# Altium footprint library TinyShuffle v.0.PcbLib: 44 footprints (part 2 of 3)
Each footprint in its own frame and in the unit in brackets; x right, y up, seen from the top. Pads: shape width x height; smd on the part's side, far side on the other; paste and mask are expansions set on the pad; w line width, h text height; cw(c..) or ccw(c..) is an arc to the next point about the centre after c.
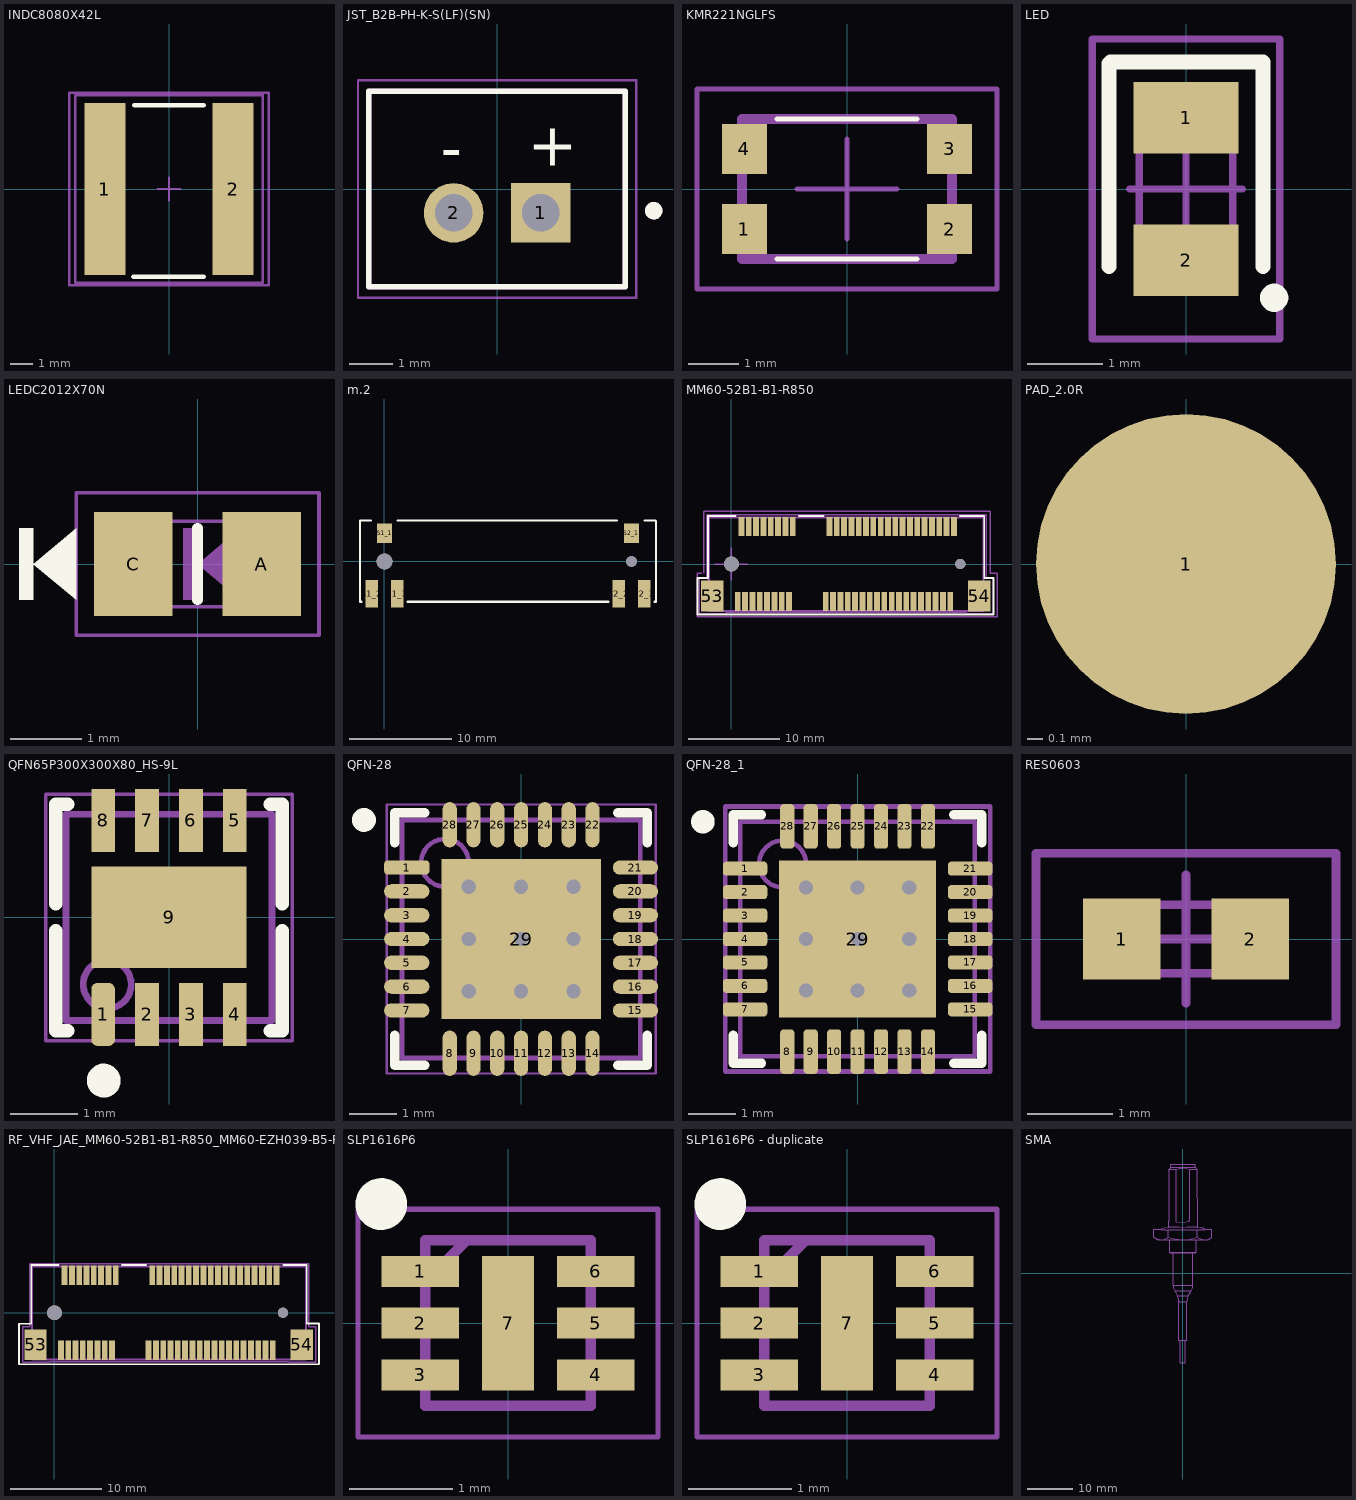
[diagram p1: the footprints below, top view; thin cyan lines are the x and y axes]

## INDC8080X42L [mm] "Chip Inductor, 2-Leads, Body 8,00x8,00mm, IPC High Density"
height 4.2
pads (2):
  rect 1.8x7.5 smd: 1(-2.8,0) 2(2.8,0)
Top Overlay:
  lines w0.2: -1.549,-3.835 1.524,-3.835 ; -1.524,3.658 1.524,3.658
Top Assembly:
  lines w0.1: -4.1,-4.1 -4.1,4.1 4.1,4.1 4.1,-4.1 -4.1,-4.1
Top Courtyard:
  lines w0.1: -0.5,0 0.5,0 ; 0,-0.5 0,0.5 ; -4.35,-4.2 -4.35,4.2 4.35,4.2 4.35,-4.2 -4.35,-4.2
3D body "INDC8080X42L.step": height 4.2, standoff 0, extent -4.1,-4.1 4.1,4.1

## JST_B2B-PH-K-S(LF)(SN) [mm]
pads (2):
  rect 1.368x1.368 hole 0.86: 1(1,-0.55)
  round 1.368 hole 0.86: 2(-1,-0.55)
Top Overlay:
  circle w0.2: c3.6,-0.5 r0.1
  lines w0.127: -2.95,-2.25 -2.95,2.25 2.95,2.25 2.95,-2.25 -2.95,-2.25
  text "-" at -1.3,0.45 h1
  text "+" at 0.7,0.533 h1
Top Component Outline:
  circle w0.2: c3.6,-0.5 r0.1
  lines w0.127: -2.95,-2.25 2.95,-2.25 2.95,2.25 -2.95,2.25 -2.95,-2.25
Top Courtyard:
  lines w0.05: -3.2,-2.5 3.2,-2.5 3.2,2.5 -3.2,2.5 -3.2,-2.5
3D body "B2B-PH-K-S(LF)(SN)--3DModel-STEP-56544.STEP": height 6.01, standoff -3.39, extent -2.95,-2.25 2.95,2.25

## KMR221NGLFS [mm]
pads (4):
  rect 0.9x1 smd: 1(-2.05,-0.8) 2(2.05,-0.8) 3(2.05,0.8) 4(-2.05,0.8)
Top Overlay:
  lines w0.1: -1.4,-1.4 1.4,-1.4 ; -1.4,1.4 1.4,1.4
Top Component Outline:
  lines w0.2: -2.1,-1.4 -2.1,1.4 2.1,1.4 2.1,-1.4 -2.1,-1.4
Top Courtyard:
  lines w0.1: -1,0 0,0 ; 0,-1 0,0 ; 0,1 0,0 ; 1,0 0,0 ; -3,-2 -3,2 3,2 3,-2 -3,-2
3D body "User Library-Switch-CK-KMR2.STEP": height 2.1, standoff 0, extent -2.35,-1.478 2.25,1.522

## LED [mm]
pads (2):
  rect 1.4x0.95 smd: 1(0,0.95) 2(0,-0.95)
Top Overlay:
  circle w0.254: c1.175,-1.45 r0.062
  lines w0.2: -1.025,-1.034 -1.025,1.675 -1.009,1.691 1.025,1.691 1.025,-1.034
Top Component Outline:
  lines w0.1: -0.625,-1 0.625,-1 0.625,1 -0.625,1 -0.625,-1
Top Courtyard:
  lines w0.1: -0.75,0 0,0 ; 0,-0.75 0,0 ; 0,0.75 0,0 ; 0.75,0 0,0 ; -1.25,-2 -1.25,2 1.25,2 1.25,-2 -1.25,-2
3D body "User Library-KP-2012.STEP": height 1.1, standoff 0, extent -0.625,-1.001 0.625,1.001

## LEDC2012X70N [mm]
pads (2):
  rect 1.1x1.45 smd paste-0.05: A(0.9,0) C(-0.9,0)
Top Overlay:
  region: -2.3,0 -1.7,-0.5 -1.7,0
  region: -2.5,0 -2.5,-0.5 -2.3,-0.5 -2.3,0
  region: -2.3,0 -1.7,0.5 -1.7,0
  region: -2.5,0 -2.5,0.5 -2.3,0.5 -2.3,0
  lines w0.152: 0,-0.5 0,0.5
Top Component Outline:
  region: -0.5,-0.6 -1,-0.6 -1,0.6 -0.5,0.6
  region: 0,0 0.6,-0.5 0.6,0
  region: -0.2,0 -0.2,-0.5 0,-0.5 0,0
  region: 0,0 0.6,0.5 0.6,0
  region: -0.2,0 -0.2,0.5 0,0.5 0,0
  lines w0.05: -1,-0.6 -1,0.6 1,0.6 1,-0.6 -1,-0.6
Top Courtyard:
  lines w0.05: -1.7,-1 -1.7,1 1.7,1 1.7,-1 -1.7,-1
3D body "LED_598-8110-107F_DIA.step": height 0.71, standoff 0, extent -1.003,-0.622 1.003,0.622

## m.2 [mm]
pads (8):
  rect 1.5x1.9 smd: S1_1(0.009,2.751) S2_1(24.209,2.751)
  rect 1.2x2.7 smd: S1_2(-1.241,-3.149) S1_3(1.259,-3.149) S2_2(22.959,-3.149) S2_3(25.459,-3.149)
  round 1.55 hole 1.55 unplated mask+0.102: ""(0.009,0.001)
  round 1.05 hole 1.05 unplated: ""(24.209,0.001)
Top Overlay:
  lines w0.2: -2.391,4 -2.391,-3.949 -2.241,-3.949 ; 2.259,-3.949 21.959,-3.949 ; 26.459,-3.949 26.609,-3.949 26.609,3.951
  lines w0.203: -2.391,4 -1.3,4 ; 1.3,4 22.8,4 ; 25.5,4 26.559,4
Mechanical 6:
  lines w0.127: 26.609,-3.949 26.609,3.951 26.609,-3.949
3D body "K3D-MM60-EZH039-B5-R2 JAE Connector Division Proprietary.STEP": height 4.7, standoff -0.9, extent -2.391,-3.924 26.609,3.976

## MM60-52B1-B1-R850 [mil] "PCIE CARD CONNECTOR"
height 45.67
pads (56):
  rect 25x83 smd mask+0.79: 1(27.56,-161.41) 2(43.31,161.42) 3(59.05,-161.41) 4(74.8,161.42) 5(90.55,-161.41) 6(106.3,161.42) 7(122.05,-161.41) 8(137.79,161.42) 9(153.54,-161.41) 10(169.29,161.42) 11(185.04,-161.41) 12(200.79,161.42) 13(216.53,-161.41) 14(232.28,161.42) 15(248.03,-161.41) 16(263.78,161.42) 17(405.51,-161.41) 18(421.26,161.42) 19(437.01,-161.41) 20(452.76,161.42) 21(468.5,-161.41) 22(484.25,161.42) 23(500,-161.41) 24(515.75,161.42) 25(531.5,-161.41) 26(547.24,161.42) 27(562.99,-161.41) 28(578.74,161.42) 29(594.49,-161.41) 30(610.24,161.42) 31(625.98,-161.41) 32(641.73,161.42) 33(657.48,-161.41) 34(673.23,161.42) 35(688.98,-161.41) 36(704.72,161.42) 37(720.47,-161.41) 38(736.22,161.42) 39(751.97,-161.41) 40(767.72,161.42) 41(783.46,-161.41) 42(799.21,161.42) 43(814.96,-161.41) 44(830.71,161.42) 45(846.46,-161.41) 46(862.2,161.42) 47(877.95,-161.41) 48(893.7,161.42) 49(909.45,-161.41) 50(925.2,161.42) 51(940.94,-161.41) 52(956.69,161.42)
  rect 96x132 smd: 53(-81.69,-137.79) 54(1065.94,-137.79)
  round 64.02 hole 64 unplated: ""(0,0)
  round 44.02 hole 44 unplated: ""(984.25,0)
Top Overlay:
  lines w7.99: 17.53,205.79 -100,205.79 -100,-60 -146,-60 -146,-217 1127,-217 1127,-60 1087,-60 1087,205.79 982.48,205.79 ; 289.56,205.79 395.48,205.79
Top Solder:
  region: 984.25,32.28 975.9,31.18 968.11,27.95 961.43,22.83 956.3,16.14 953.08,8.36 951.98,0 953.08,-8.35 956.3,-16.14 961.43,-22.82 968.11,-27.95 975.9,-31.17 984.25,-32.27 992.61,-31.17 1000.39,-27.95 1007.07,-22.82 1012.2,-16.14 1015.43,-8.35 1016.53,0 1015.43,8.36 1012.2,16.14 1007.07,22.83 1000.39,27.95 992.61,31.18
  region: 0,42.36 -10.96,40.92 -21.18,36.69 -29.95,29.95 -36.69,21.18 -40.92,10.96 -42.36,0 -40.92,-10.96 -36.69,-21.18 -29.95,-29.96 -21.18,-36.69 -10.96,-40.92 0,-42.36 10.96,-40.92 21.18,-36.69 29.95,-29.96 36.69,-21.18 40.92,-10.96 42.36,0 40.92,10.96 36.69,21.18 29.95,29.95 21.18,36.69 10.96,40.92
Top Component Outline:
  lines w5: -98.37,-203.21 1082.63,-203.21 1082.63,198.79 -98.37,198.79 -98.37,-203.21
  lines w6: -139,-213.16 -21.09,-213.16 -21.09,-210.58 1010.54,-210.58 1010.54,-213.16 1126.54,-213.16 1126.54,-61.16 1095.22,-61.16 1095.22,211.42 -106,211.42 -106,-61.16 -139,-61.16 -139,-213.16 ; -95.78,-200.58 1085.22,-200.58 1085.22,201.42 -95.78,201.42 -95.78,-200.58
Top Courtyard:
  lines w5.91: -127.95,-39.37 -147.64,-39.37 -147.64,-226.38 1141.73,-226.38 1141.73,-39.37 1112.2,-39.37 1112.2,226.38 -118.11,226.38 -118.11,-39.37 ; -70.87,0 0,0 ; 0,-70.87 0,0 ; 0,70.87 0,0 ; 70.87,0 0,0
3D body "K3D-MM60-52B1-B1-R2 JAE Connector Division Proprietary.STEP": height 149.61, standoff -35.43, extent -92.92,-198.43 1076.37,195.27

## PAD_2.0R [mm] "Pad, SMD, R=2.0 mm"
height 0.05
pads (1):
  round 2 smd paste-1: 1(0,0)
3D body: height 0.05, standoff 0, extent -0.992,-0.998 1,0.998

## QFN65P300X300X80_HS-9L [mm] "QFN, 8-Leads, Body 3,00x3,00mm, Pitch 0,65mm, Thermal Pad 2,23x1,48mm, IPC High Density"
height 0.8
pads (9):
  rrect50% 0.35x0.93 smd mask+0.05: 1(-0.975,-1.435)
  rect 0.35x0.93 smd mask+0.05: 2(-0.325,-1.435) 3(0.325,-1.435) 4(0.975,-1.435) 5(0.975,1.435) 6(0.325,1.435) 7(-0.325,1.435) 8(-0.975,1.435)
  rect 2.3x1.5 smd mask+0.05: 9(0,0)
Top Overlay:
  circle w0.25: c-0.965,-2.413 r0.125
  lines w0.2: -1.675,-0.2 -1.675,-1.675 -1.5,-1.675 ; -1.675,0.2 -1.675,1.675 -1.5,1.675 ; 1.5,-1.675 1.675,-1.675 1.675,-0.2 ; 1.5,1.675 1.675,1.675 1.675,0.2
Top Assembly:
  circle w0.1: c-0.914,-0.991 r0.356
  lines w0.1: -1.525,-1.525 1.525,-1.525 1.525,1.525 -1.525,1.525 -1.525,-1.525
  text ".Designator" at -0.914,0.127 h1
Top Courtyard:
  lines w0.05: -1.825,-1.825 1.825,-1.825 1.825,1.825 -1.825,1.825 -1.825,-1.825
  lines w0.1: -0.5,0 0.5,0 ; 0,-0.5 0,0.5
3D body: height 0.8, standoff 0.01, extent -1.525,-1.525 1.525,1.525

## QFN-28 [mm] "QFN, 28-Leads, Body 5,00x5,00mm, Pitch 0,50mm, Thermal Pad 3,20x3,20mm, IPC High Density"
height 0.8
pads (29):
  rrect50% 0.95x0.3 smd: 1(-2.4,1.5)
  oval 0.95x0.3 smd: 2(-2.4,1) 3(-2.4,0.5) 4(-2.4,0) 5(-2.4,-0.5) 6(-2.4,-1) 7(-2.4,-1.5) 15(2.4,-1.5) 16(2.4,-1) 17(2.4,-0.5) 18(2.4,0) 19(2.4,0.5) 20(2.4,1) 21(2.4,1.5)
  oval 0.3x0.95 smd: 8(-1.5,-2.4) 9(-1,-2.4) 10(-0.5,-2.4) 11(0,-2.4) 12(0.5,-2.4) 13(1,-2.4) 14(1.5,-2.4) 22(1.5,2.4) 23(1,2.4) 24(0.5,2.4) 25(0,2.4) 26(-0.5,2.4) 27(-1,2.4) 28(-1.5,2.4)
  rect 3.35x3.35 smd: 29(0,0)
via 0,0 diameter 0.5 hole 0.3
via 1.1,-1.1 diameter 0.5 hole 0.3
via 0,-1.1 diameter 0.5 hole 0.3
via -1.1,-1.1 diameter 0.5 hole 0.3
via 1.1,0 diameter 0.5 hole 0.3
via -1.1,0 diameter 0.5 hole 0.3
via 1.1,1.1 diameter 0.5 hole 0.3
via 0,1.1 diameter 0.5 hole 0.3
via -1.1,1.1 diameter 0.5 hole 0.3
Top Overlay:
  circle w0.25: c-3.3,2.5 r0.125
  lines w0.2: -2.65,-2.025 -2.65,-2.65 -2.025,-2.65 ; -2.65,2.025 -2.65,2.65 -2.025,2.65 ; 2.025,-2.65 2.65,-2.65 2.65,-2.025 ; 2.025,2.65 2.65,2.65 2.65,2.025
Mechanical 11:
  circle w0.1: c-1.6,1.6 r0.5
  lines w0.1: -2.5,-2.5 2.5,-2.5 2.5,2.5 -2.5,2.5 -2.5,-2.5
Top Courtyard:
  lines w0.05: -2.825,-2.825 2.825,-2.825 2.825,2.825 -2.825,2.825 -2.825,-2.825
  lines w0.1: -0.5,0 0.5,0 ; 0,-0.5 0,0.5
3D body: height 0.8, standoff 0.01, extent -2.5,-2.5 2.5,2.5

## QFN-28_1 [mm] "QFN, 28-Leads, Body 5,00x5,00mm, Pitch 0,50mm, Thermal Pad 3,35x3,35mm, IPC High Density"
height 0.75
pads (29):
  rrect50% 0.95x0.3 smd: 1(-2.4,1.5) 2(-2.4,1) 3(-2.4,0.5) 4(-2.4,0) 5(-2.4,-0.5) 6(-2.4,-1) 7(-2.4,-1.5) 15(2.4,-1.5) 16(2.4,-1) 17(2.4,-0.5) 18(2.4,0) 19(2.4,0.5) 20(2.4,1) 21(2.4,1.5)
  rrect50% 0.3x0.95 smd: 8(-1.5,-2.4) 9(-1,-2.4) 10(-0.5,-2.4) 11(0,-2.4) 12(0.5,-2.4) 13(1,-2.4) 14(1.5,-2.4) 22(1.5,2.4) 23(1,2.4) 24(0.5,2.4) 25(0,2.4) 26(-0.5,2.4) 27(-1,2.4) 28(-1.5,2.4)
  rect 3.35x3.35 smd: 29(0,0)
via -1.1,1.1 diameter 0.5 hole 0.3
via 0,1.1 diameter 0.5 hole 0.3
via 1.1,1.1 diameter 0.5 hole 0.3
via -1.1,0 diameter 0.5 hole 0.3
via 0,0 diameter 0.5 hole 0.3
via 1.1,0 diameter 0.5 hole 0.3
via -1.1,-1.1 diameter 0.5 hole 0.3
via 0,-1.1 diameter 0.5 hole 0.3
via 1.1,-1.1 diameter 0.5 hole 0.3
Top Overlay:
  circle w0.25: c-3.3,2.5 r0.125
  lines w0.2: -2.65,-2.05 -2.65,-2.65 -2.05,-2.65 ; -2.65,2.05 -2.65,2.65 -2.05,2.65 ; 2.05,-2.65 2.65,-2.65 2.65,-2.05 ; 2.05,2.65 2.65,2.65 2.65,2.05
Top Solder:
  region: -2.972,-1.753 -1.753,-1.753 -1.753,-2.972 1.753,-2.972 1.753,-1.778 2.972,-1.778 2.972,1.753 1.829,1.753 1.829,2.972 -1.778,2.972 -1.778,1.753 -2.972,1.753
Top Assembly:
  circle w0.1: c-1.6,1.6 r0.5
  lines w0.1: -2.5,-2.5 -2.5,2.5 2.5,2.5 2.5,-2.5 -2.5,-2.5
Top Courtyard:
  lines w0.1: -0.5,0 0.5,0 ; 0,-0.5 0,0.5 ; -2.825,-2.825 -2.825,2.825 2.825,2.825 2.825,-2.825 -2.825,-2.825
3D body: height 0.75, standoff 0.01, extent -2.5,-2.5 2.5,2.5

## RES0603 [mm]
pads (2):
  rect 0.9x0.95 smd paste-0.05: 1(-0.75,0) 2(0.75,0)
Top Component Outline:
  lines w0.1: -0.775,-0.4 -0.775,0.4 0.775,0.4 0.775,-0.4 -0.775,-0.4
Top Courtyard:
  lines w0.1: -0.75,0 0,0 ; 0,-0.75 0,0 ; 0,0.75 0,0 ; 0.75,0 0,0 ; -1.75,-1 -1.75,1 1.75,1 1.75,-1 0,-1 -1.75,-1
3D body "CPF0603B330RE1.stp": height 0.55, standoff 0, extent -0.775,-0.4 0.775,0.4

## RF_VHF_JAE_MM60-52B1-B1-R850_MM60-EZH039-B5-R850_w_2005_mPCIe_card [mil]
height 45.67
pads (56):
  rect 25x83 smd mask+0.79: 1(27.56,-161.41) 2(43.31,161.42) 3(59.05,-161.41) 4(74.8,161.42) 5(90.55,-161.41) 6(106.3,161.42) 7(122.05,-161.41) 8(137.79,161.42) 9(153.54,-161.41) 10(169.29,161.42) 11(185.04,-161.41) 12(200.79,161.42) 13(216.53,-161.41) 14(232.28,161.42) 15(248.03,-161.41) 16(263.78,161.42) 17(405.51,-161.41) 18(421.26,161.42) 19(437.01,-161.41) 20(452.76,161.42) 21(468.5,-161.41) 22(484.25,161.42) 23(500,-161.41) 24(515.75,161.42) 25(531.5,-161.41) 26(547.24,161.42) 27(562.99,-161.41) 28(578.74,161.42) 29(594.49,-161.41) 30(610.24,161.42) 31(625.98,-161.41) 32(641.73,161.42) 33(657.48,-161.41) 34(673.23,161.42) 35(688.98,-161.41) 36(704.72,161.42) 37(720.47,-161.41) 38(736.22,161.42) 39(751.97,-161.41) 40(767.72,161.42) 41(783.46,-161.41) 42(799.21,161.42) 43(814.96,-161.41) 44(830.71,161.42) 45(846.46,-161.41) 46(862.2,161.42) 47(877.95,-161.41) 48(893.7,161.42) 49(909.45,-161.41) 50(925.2,161.42) 51(940.94,-161.41) 52(956.69,161.42)
  rect 96x132 smd: 53(-81.69,-137.79) 54(1065.94,-137.79)
  round 64.02 hole 64 unplated: ""(0,0)
  round 44.02 hole 44 unplated: ""(984.25,0)
Top Overlay:
  lines w7.99: 17.53,205.79 -100,205.79 -100,-47 -153,-47 -153,-222 1140,-222 1140,-46 1087,-46 1087,205.79 986,205.79 ; 289.56,205.79 395.48,205.79
Top Solder:
  rectangle: 14,-204 262,-119
  rectangle: 28,119 276,204
  rectangle: 408,119 970,204
  rectangle: 391,-204 954,-119
  region: 984.25,32.28 975.9,31.18 968.11,27.95 961.43,22.83 956.3,16.14 953.08,8.36 951.98,0 953.08,-8.35 956.3,-16.14 961.43,-22.82 968.11,-27.95 975.9,-31.17 984.25,-32.27 992.61,-31.17 1000.39,-27.95 1007.07,-22.82 1012.2,-16.14 1015.43,-8.35 1016.53,0 1015.43,8.36 1012.2,16.14 1007.07,22.83 1000.39,27.95 992.61,31.18
  region: 0,42.36 -10.96,40.92 -21.18,36.69 -29.95,29.95 -36.69,21.18 -40.92,10.96 -42.36,0 -40.92,-10.96 -36.69,-21.18 -29.95,-29.96 -21.18,-36.69 -10.96,-40.92 0,-42.36 10.96,-40.92 21.18,-36.69 29.95,-29.96 36.69,-21.18 40.92,-10.96 42.36,0 40.92,10.96 36.69,21.18 29.95,29.95 21.18,36.69 10.96,40.92
Top Component Outline:
  lines w5: -98.37,-203.21 1082.63,-203.21 1082.63,198.79 -98.37,198.79 -98.37,-203.21
  lines w6: -137.09,-213.16 -21.09,-213.16 -21.09,-210.58 1010.54,-210.58 1010.54,-213.16 1126.54,-213.16 1126.54,-61.16 1095.22,-61.16 1095.22,211.42 -106,211.42 -106,-61.16 -137.09,-61.16 -137.09,-213.16 ; -95.78,-200.58 1085.22,-200.58 1085.22,201.42 -95.78,201.42 -95.78,-200.58
3D body "K3D-MM60-52B1-B1-R2 JAE Connector Division Proprietary.STEP": height 149.61, standoff -35.43, extent -92.92,-198.43 1076.37,195.27
3D body "TILE-LB_102120211208.step": height 271.74, standoff 69.61, extent -97.79,-3.35 1083.31,2002.56

## SLP1616P6 [mm] "SON50P160X160X65-7N"
height 0.017
pads (7):
  rect 0.75x0.3 smd paste-0.03 mask+0.127: 1(-0.85,0.5) 2(-0.85,0) 3(-0.85,-0.5) 4(0.85,-0.5) 5(0.85,0) 6(0.85,0.5)
  rect 0.5x1.3 smd paste-0.05 mask+0.127: 7(0,0)
Top Overlay:
  circle w0.25: c-1.225,1.15 r0.125
Top Courtyard:
  lines w0.1: -0.8,0.4 -0.4,0.8 ; -0.8,-0.8 -0.8,0.8 0.8,0.8 0.8,-0.8 -0.8,-0.8
Mechanical 20:
  lines w0.05: -1.45,-1.1 -1.45,1.1 1.45,1.1 1.45,-1.1 -1.45,-1.1
3D body "UCLAMP3306P.TCT.stp": height 0.65, standoff 0, extent -0.85,-0.8 0.85,0.8

## SLP1616P6 - duplicate [mm] "SON50P160X160X65-7N"
height 0.017
pads (7):
  rect 0.75x0.3 smd paste-0.03 mask+0.127: 1(-0.85,0.5) 2(-0.85,0) 3(-0.85,-0.5) 4(0.85,-0.5) 5(0.85,0) 6(0.85,0.5)
  rect 0.5x1.3 smd paste-0.05 mask+0.127: 7(0,0)
Top Overlay:
  circle w0.25: c-1.225,1.15 r0.125
Top Courtyard:
  lines w0.1: -0.8,0.4 -0.4,0.8 ; -0.8,-0.8 -0.8,0.8 0.8,0.8 0.8,-0.8 -0.8,-0.8
Mechanical 20:
  lines w0.05: -1.45,-1.1 -1.45,1.1 1.45,1.1 1.45,-1.1 -1.45,-1.1
3D body "UCLAMP3306P.TCT.stp": height 0.65, standoff 0, extent -0.85,-0.8 0.85,0.8

## SMA [mm] "SMA CONNECTOR"
Top Component Outline:
  lines w0.05: -4.821,9.61 -4.504,9.908 -3.96,9.998 ; -3.955,10 cw(c-1.915,-14.405) 0,10.01 cw(c1.911,-15.771) 3.955,10 ; -3.175,9.51 -3.175,7.901 ; -3.095,22.676 -3.095,22.511 -3.085,11.387 -3.085,10.01 ; -3.092,22.682 -2.929,22.776 -2.722,22.895 ; -3.088,22.676 -3.084,22.685 -3.074,22.689 -3.052,22.695 -2.861,22.72 -1.41,22.72 ; -2.92,7.41 -2.92,4.6 ; -2.73,22.89 -2.73,23.007 -2.665,23.15 ; -2.159,4.5 -2.159,-2.555 ; -1.41,22.436 -1.41,11.346 0.178,11.213 1.41,11.452 1.41,11.617 1.382,22.733 ; -1.41,22.511 -1.41,22.72 ; -0.565,-14.55 -0.565,-19.55 0.565,-19.55 0.565,-14.55 ; 0,9.51 0,10.002 ; 2.159,4.5 2.159,-2.555 ; 2.92,7.41 2.92,4.6 ; 2.999,22.816 2.665,23.15 ; 3.097,10.01 2.994,22.811 2.997,22.809 2.998,22.806 2.996,22.805 2.991,22.803 2.973,22.799 2.906,22.791 1.382,22.733 ; 3.175,9.51 3.175,7.901 ; 3.96,9.998 4.393,9.958 4.819,9.61 ; -6.351,7.901 -5.5,7.41 5.5,7.41 6.351,7.901 ; -6.351,7.901 -6.351,9.61 -4.76,9.61 -4.76,9.51 4.76,9.51 4.76,9.61 6.351,9.61 6.351,7.901 ; -6.351,7.901 -5.642,7.568 -4.763,7.41 -4.075,7.508 -3.175,7.901 ; -3.175,7.901 -1.758,7.568 0,7.41 1.376,7.508 3.175,7.901 ; -2.92,4.6 -2.82,4.5 2.82,4.5 2.92,4.6 ; -2.92,4.6 2.92,4.6 ; -2.665,23.15 -2.665,23.81 -2.565,23.91 2.565,23.91 2.665,23.81 2.665,23.15 ; -2.665,23.15 2.665,23.15 ; -2.159,-2.555 ccw(c0.381,-2.555) -1.819,-3.825 ; -2.159,-2.555 2.159,-2.555 ; -1.819,-3.825 1.819,-3.825 ; -1.819,-3.825 -1.219,-4.864 ; -1.41,22.72 -1.023,22.876 -0.733,22.964 -0.324,23.024 0.202,23.053 0.846,22.933 1.382,22.733 ; -1.219,-4.864 cw(c-3.419,-6.134) -0.879,-6.134 ; -1.219,-4.864 1.219,-4.864 ; -0.879,-6.134 0.879,-6.134 ; -0.879,-6.134 -0.879,-14.55 0.879,-14.55 0.879,-6.134 ; 0.879,-6.134 cw(c3.419,-6.134) 1.219,-4.864 ; 1.219,-4.864 1.819,-3.825 ; 1.819,-3.825 ccw(c-0.381,-2.555) 2.159,-2.555 ; 3.175,7.901 3.884,7.568 4.763,7.41 5.451,7.508 6.351,7.901
3D body "336319-12-SMA.STEP": height 11.5, standoff 0.5, extent -6.351,-19.55 6.351,23.91